# Altium footprint library 1MaxPcb.PcbLib: 187 footprints (part 4 of 12)
Each footprint in its own frame and in the unit in brackets; x right, y up, seen from the top. Pads: shape width x height; smd on the part's side, far side on the other; paste and mask are expansions set on the pad; w line width, h text height; cw(c..) or ccw(c..) is an arc to the next point about the centre after c.
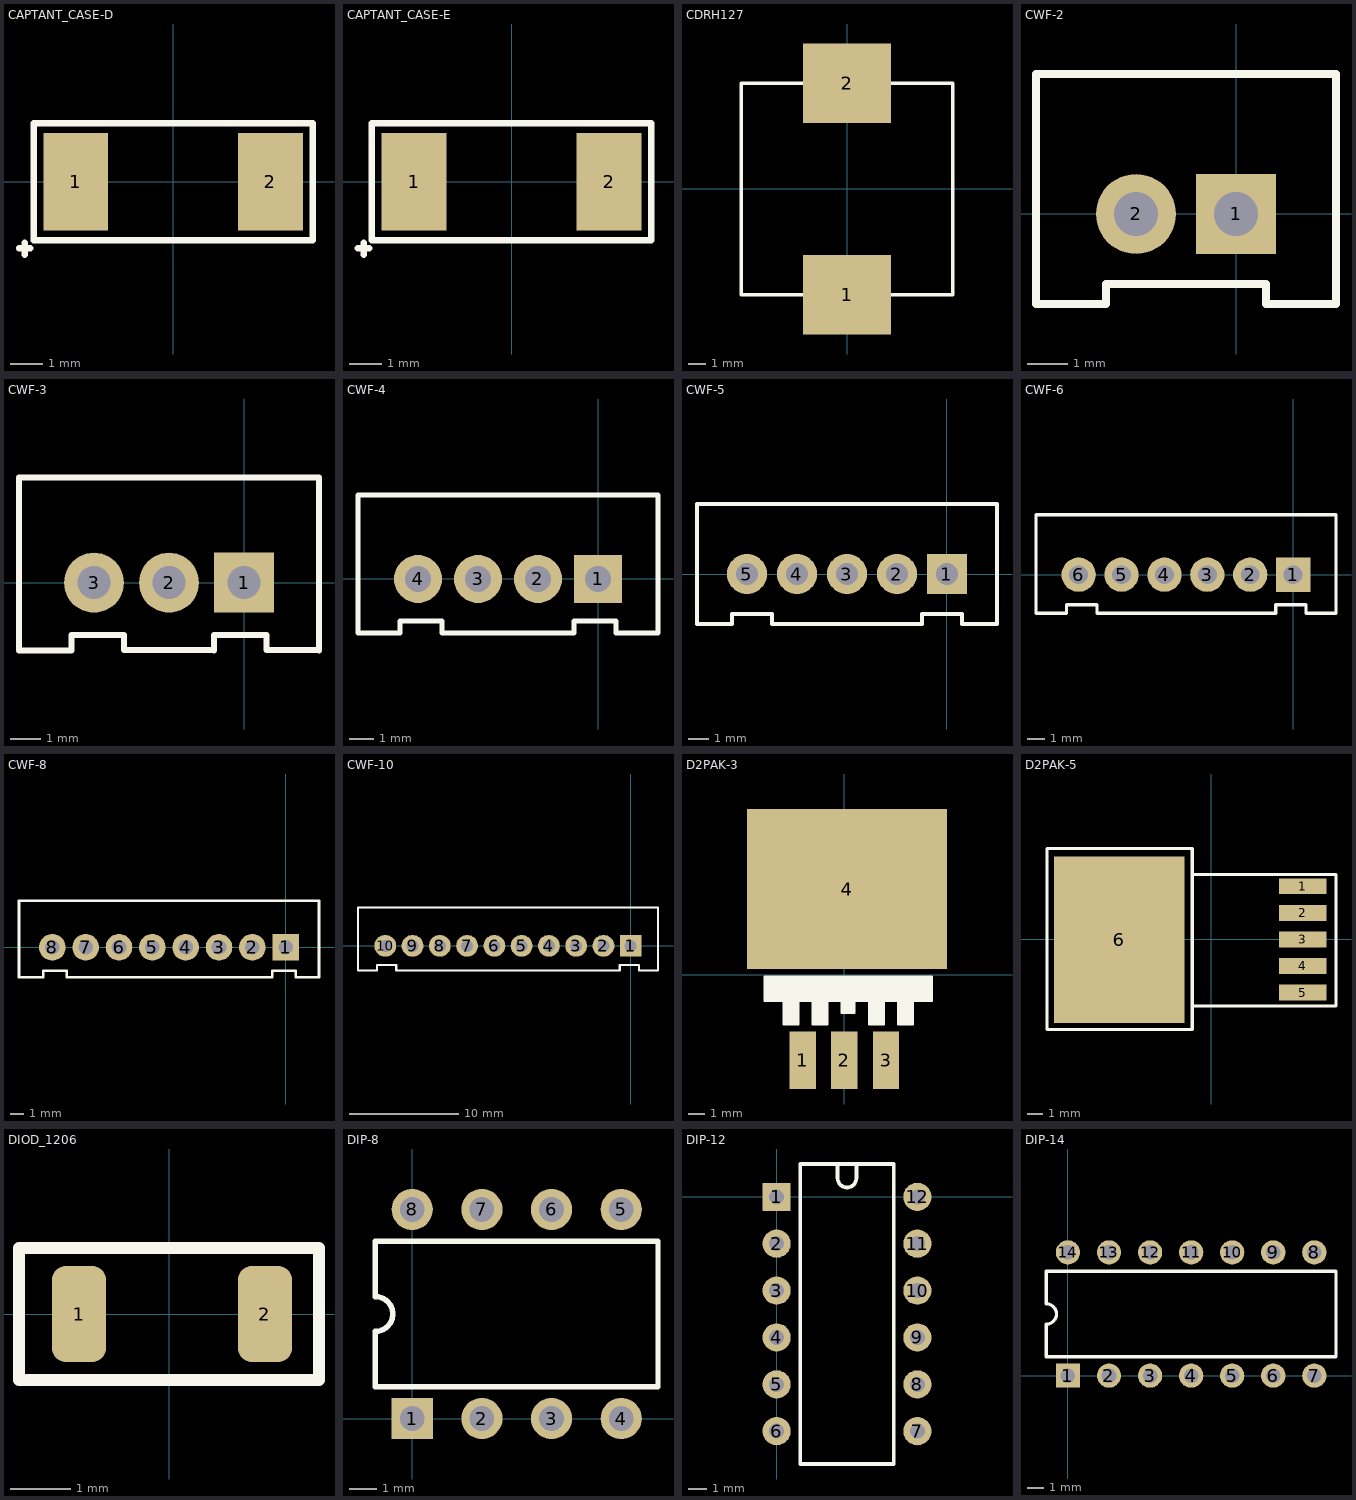
[diagram p3: the footprints below, top view; thin cyan lines are the x and y axes]

## CAPTANT_CASE-D [mm] "\"J\" вывод 7343 (2917)"
pads (2):
  rect 2x3 smd: 1(-3,0) 2(3,0)
Top Overlay:
  lines w0.2: -4.75,-2.05 -4.4,-2.05 ; -4.575,-2.25 -4.575,-1.875 ; -4.3,-1.8 -4.3,1.8 4.3,1.8 4.3,-1.8 -4.3,-1.8
3D body "User Library-CaseD_7343-31.STEP": height 2.8, standoff 0, extent -3.65,-2.15 3.65,2.15

## CAPTANT_CASE-E [mm] "\"J\" вывод 7343 (2917)"
pads (2):
  rect 2x3 smd: 1(-3,0) 2(3,0)
Top Overlay:
  lines w0.2: -4.725,-2.05 -4.375,-2.05 ; -4.55,-2.25 -4.55,-1.875 ; -4.3,-1.8 4.3,-1.8 4.3,1.8 -4.3,1.8 -4.3,-1.8
3D body "User Library-AVX_E_CASE.STEP": height 4.2, standoff 0, extent -3.7,-2.225 3.701,2.225

## CDRH127 [mm]
pads (2):
  rect 5x4.5 smd: 1(0,-6) 2(0,6)
Top Overlay:
  lines w0.2: -6,-6 -6,6 6,6 6,-6 -6,-6
3D body "70108.stp": height 10, standoff 0, extent -6,-5.875 6,6.125

## CWF-2 [mm]
height 14.2
pads (2):
  rect 2x2 hole 1.1: 1(0,0)
  round 2 hole 1.1: 2(-2.5,0)
Top Overlay:
  lines w0.2: -5,-2.25 -5,3.5 2.5,3.5 2.5,-2.248 0.75,-2.249 0.75,-1.75 -3.25,-1.75 -3.25,-2.25 -5,-2.25
3D body "CWF-2.step": height 7.1, standoff -3.4, extent -5,-2.2 2.5,3.55

## CWF-3 [mm]
height 14.2
pads (3):
  rect 2x2 hole 1.1: 1(0,0)
  round 2 hole 1.1: 2(-2.5,0) 3(-5,0)
Top Overlay:
  lines w0.2: -5.75,-2.253 -7.5,-2.253 -7.5,3.5 2.5,3.5 2.5,-2.253 ; -5.75,-2.25 -5.75,-1.748 -4,-1.748 -4,-2.248 ; -4,-2.25 -1.002,-2.25 ; -1,-2.252 -1,-1.75 0.75,-1.75 0.75,-2.25 2.497,-2.25
3D body "CWF-3.step": height 7.1, standoff -3.4, extent -7.5,-2.25 2.5,3.5

## CWF-4 [mm]
height 14.2
pads (4):
  rect 2x2 hole 1.1: 1(0,0)
  round 2 hole 1.1: 2(-2.5,0) 3(-5,0) 4(-7.5,0)
Top Overlay:
  lines w0.2: -8.25,-2.253 -10,-2.253 -10,3.5 2.5,3.5 2.5,-2.253 ; -8.25,-2.25 -8.25,-1.748 -6.5,-1.748 -6.5,-2.248 ; -6.5,-2.25 -1.002,-2.25 ; -1,-2.252 -1,-1.75 0.75,-1.75 0.75,-2.25 2.497,-2.25
3D body "CWF-4.step": height 7.1, standoff -3.4, extent -9.95,-2.25 2.45,3.5

## CWF-5 [mm]
height 14.2
pads (5):
  rect 2x2 hole 1.1: 1(0,0)
  round 2 hole 1.1: 2(-2.5,0) 3(-5,0) 4(-7.5,0) 5(-10,0)
Top Overlay:
  lines w0.2: -12.5,-2.5 -10.75,-2.5 -10.75,-2 -8.75,-2 -8.75,-2.5 -1.25,-2.5 -1.25,-2 0.75,-2 0.75,-2.5 2.5,-2.5 2.5,3.5 -12.5,3.5 -12.5,-2.5
3D body "CWF-5.step": height 7.1, standoff -3.4, extent -12.5,-2.2 2.5,3.55

## CWF-6 [mm]
height 14.2
pads (6):
  rect 2x2 hole 1.1: 1(0,0)
  round 2 hole 1.1: 2(-2.5,0) 3(-5,0) 4(-7.5,0) 5(-10,0) 6(-12.5,0)
Top Overlay:
  lines w0.2: -1.002,-2.25 -11.43,-2.25 -11.43,-1.75 -13.208,-1.75 -13.208,-2.253 -14.986,-2.253 -14.986,3.5 2.5,3.5 2.5,-2.253 ; -1,-2.252 -1,-1.75 0.75,-1.75 0.75,-2.25 2.497,-2.25
3D body "CWF-6.step": height 7.1, standoff -3.4, extent -15,-2.25 2.5,3.5

## CWF-8 [mm]
height 14.2
pads (8):
  rect 2x2 hole 1.1: 1(0,0)
  round 2 hole 1.1: 2(-2.5,0) 3(-5,0) 4(-7.5,0) 5(-10,0) 6(-12.5,0) 7(-15,0) 8(-17.5,0)
Top Overlay:
  lines w0.2: -18.17,-2.253 -20,-2.253 -20,3.5 2.5,3.5 2.5,-2.253 ; -18.17,-2.25 -18.17,-1.748 -16.42,-1.748 -16.42,-2.248 ; -16.42,-2.25 -1.002,-2.25 ; -1,-2.252 -1,-1.75 0.75,-1.75 0.75,-2.25 2.497,-2.25
3D body "CWF-8.step": height 7.1, standoff -3.4, extent -20,-2.125 2.5,3.625

## CWF-10 [mm]
height 14.2
pads (10):
  rect 2x2 hole 1.1: 1(0,0)
  round 2 hole 1.1: 2(-2.5,0) 3(-5,0) 4(-7.5,0) 5(-10,0) 6(-12.5,0) 7(-15,0) 8(-17.5,0) 9(-20,0) 10(-22.5,0)
Top Overlay:
  lines w0.2: -23.25,-2.253 -25,-2.253 -25,3.5 2.5,3.5 2.5,-2.253 ; -23.25,-2.25 -23.25,-1.748 -21.5,-1.748 -21.5,-2.248 ; -21.5,-2.25 -1.002,-2.25 ; -1,-2.252 -1,-1.75 0.75,-1.75 0.75,-2.25 2.497,-2.25
3D body "B10B-XH-A.STEP": height 7.1, standoff -3.3, extent -24.9,-2.375 2.5,3.375

## D2PAK-3 [mm]
pads (4):
  rect 1.6x3.5 smd mask+0.102: 1(-2.54,-5.209) 2(0,-5.209)
  rect 1.6x3.5 smd: 3(2.54,-5.209)
  rect 12.2x9.75 smd paste-25.4: 4(0.16,5.209)
Top Overlay:
  region: 5.315,-1.578 5.315,-0.109 -4.845,-0.109 -4.845,-1.578
  region: 3.283,-1.578 3.283,-3.009 4.172,-3.009 4.172,-1.578
  region: -0.146,-2.309 0.616,-2.309 0.616,-1.578 -0.146,-1.578
  region: -3.702,-1.578 -3.702,-3.009 -2.813,-3.009 -2.813,-1.578
  region: -1.924,-1.578 -1.924,-3.009 -1.035,-3.009 -1.035,-1.578
  region: 1.505,-1.578 1.505,-3.009 2.394,-3.009 2.394,-1.578
  lines w0.15: -3.702,-1.578 -3.702,-3.009 -2.813,-3.009 -2.813,-1.578 ; -1.924,-1.578 -1.924,-3.009 -1.035,-3.009 -1.035,-1.578 ; -0.146,-1.578 -0.146,-2.309 0.616,-2.309 0.616,-1.578 ; 1.505,-1.578 1.505,-3.009 2.394,-3.009 2.394,-1.578 ; 3.283,-1.578 3.283,-3.009 4.172,-3.009 4.172,-1.578 ; -4.845,-1.578 5.315,-1.578 5.315,-0.109 -4.845,-0.109 -4.845,-1.578
3D body "D2PAK.STEP": height 4.9, standoff 0, extent -5.19,-6.009 5.31,9.341

## D2PAK-5 [mil]
pads (6):
  rect 120x40 smd: 1(231.5,134) 2(231.5,67) 3(231.5,0) 4(231.5,-67) 5(231.5,-134)
  rect 330x420 smd: 6(-231.5,-1)
Top Overlay:
  lines w7.87: -47.5,-168 314.96,-168 314.96,164 -47.5,164 ; -413.5,-227 -47.5,-227 -47.5,229 -413.5,229 -413.5,-227
3D body "TO263-5-1.stp": height 162.01, standoff -3.94, extent -344.92,-192.2 229.96,194.47

## DIOD_1206 [mm]
pads (2):
  rrect50% 0.9x1.6 smd: 1(-1.5,0) 2(1.6,0)
Top Overlay:
  lines w0.2: -2.5,-1.1 -2.5,1.1 -1.3,1.1 2.5,1.1 2.5,-1.1 -2.5,-1.1
3D body "LED 1206 Red.stp": height 1.1, standoff 0, extent -1.6,-0.8 1.6,0.8

## DIP-8 [mm]
pads (8):
  rect 1.5x1.5 hole 0.9: 1(0,0)
  round 1.5 hole 0.9: 2(2.54,0) 3(5.08,0) 4(7.62,0) 5(7.62,7.62) 6(5.08,7.62) 7(2.54,7.62) 8(0,7.62)
Top Overlay:
  lines w0.2: -1.34,1.16 8.96,1.16 8.96,6.46 -1.34,6.46 -1.34,4.445 cw(c-1.34,3.81) -1.34,3.175 -1.34,1.16
3D body "MS-001.BA (DIP8).STEP": height 5.33, standoff -3.81, extent -1.29,-0.178 8.87,7.798

## DIP-12 [mm]
pads (12):
  rect 1.5x1.5 hole 0.8: 1(0,0)
  round 1.5 hole 0.8: 2(0,-2.5) 3(0,-5) 4(0,-7.5) 5(0,-10) 6(0,-12.5) 7(7.5,-12.5) 8(7.5,-10) 9(7.5,-7.5) 10(7.5,-5) 11(7.5,-2.5) 12(7.5,0)
Top Overlay:
  lines w0.2: 3.25,1.75 3.25,1 ccw(c3.75,1) 4.25,1 4.25,1.75 ; 1.25,-14.25 6.25,-14.25 6.25,1.75 1.25,1.75 1.25,-14.25
3D body "DipSwitch.SLDPRT": height 7.1, standoff -2.6, extent -1.175,-14.65 8.725,1.95

## DIP-14 [mm]
pads (14):
  rect 1.5x1.5 hole 0.9: 1(0,0)
  round 1.5 hole 0.9: 2(2.54,0) 3(5.08,0) 4(7.62,0) 5(10.16,0) 6(12.7,0) 7(15.24,0) 8(15.24,7.62) 9(12.7,7.62) 10(10.16,7.62) 11(7.62,7.62) 12(5.08,7.62) 13(2.54,7.62) 14(0,7.62)
Top Overlay:
  lines w0.2: -1.34,1.16 16.58,1.16 16.58,6.46 -1.34,6.46 -1.34,4.445 cw(c-1.34,3.81) -1.34,3.175 -1.34,1.16
3D body "MS-001.AA (DIP14).STEP": height 5.33, standoff -3.81, extent -2.273,-0.2 17.413,7.776